# Altium footprint library Relays.PcbLib: 113 footprints (part 5 of 8)
Each footprint in its own frame and in the unit in brackets; x right, y up, seen from the top. Pads: shape width x height; smd on the part's side, far side on the other; paste and mask are expansions set on the pad; w line width, h text height; cw(c..) or ccw(c..) is an arc to the next point about the centre after c.
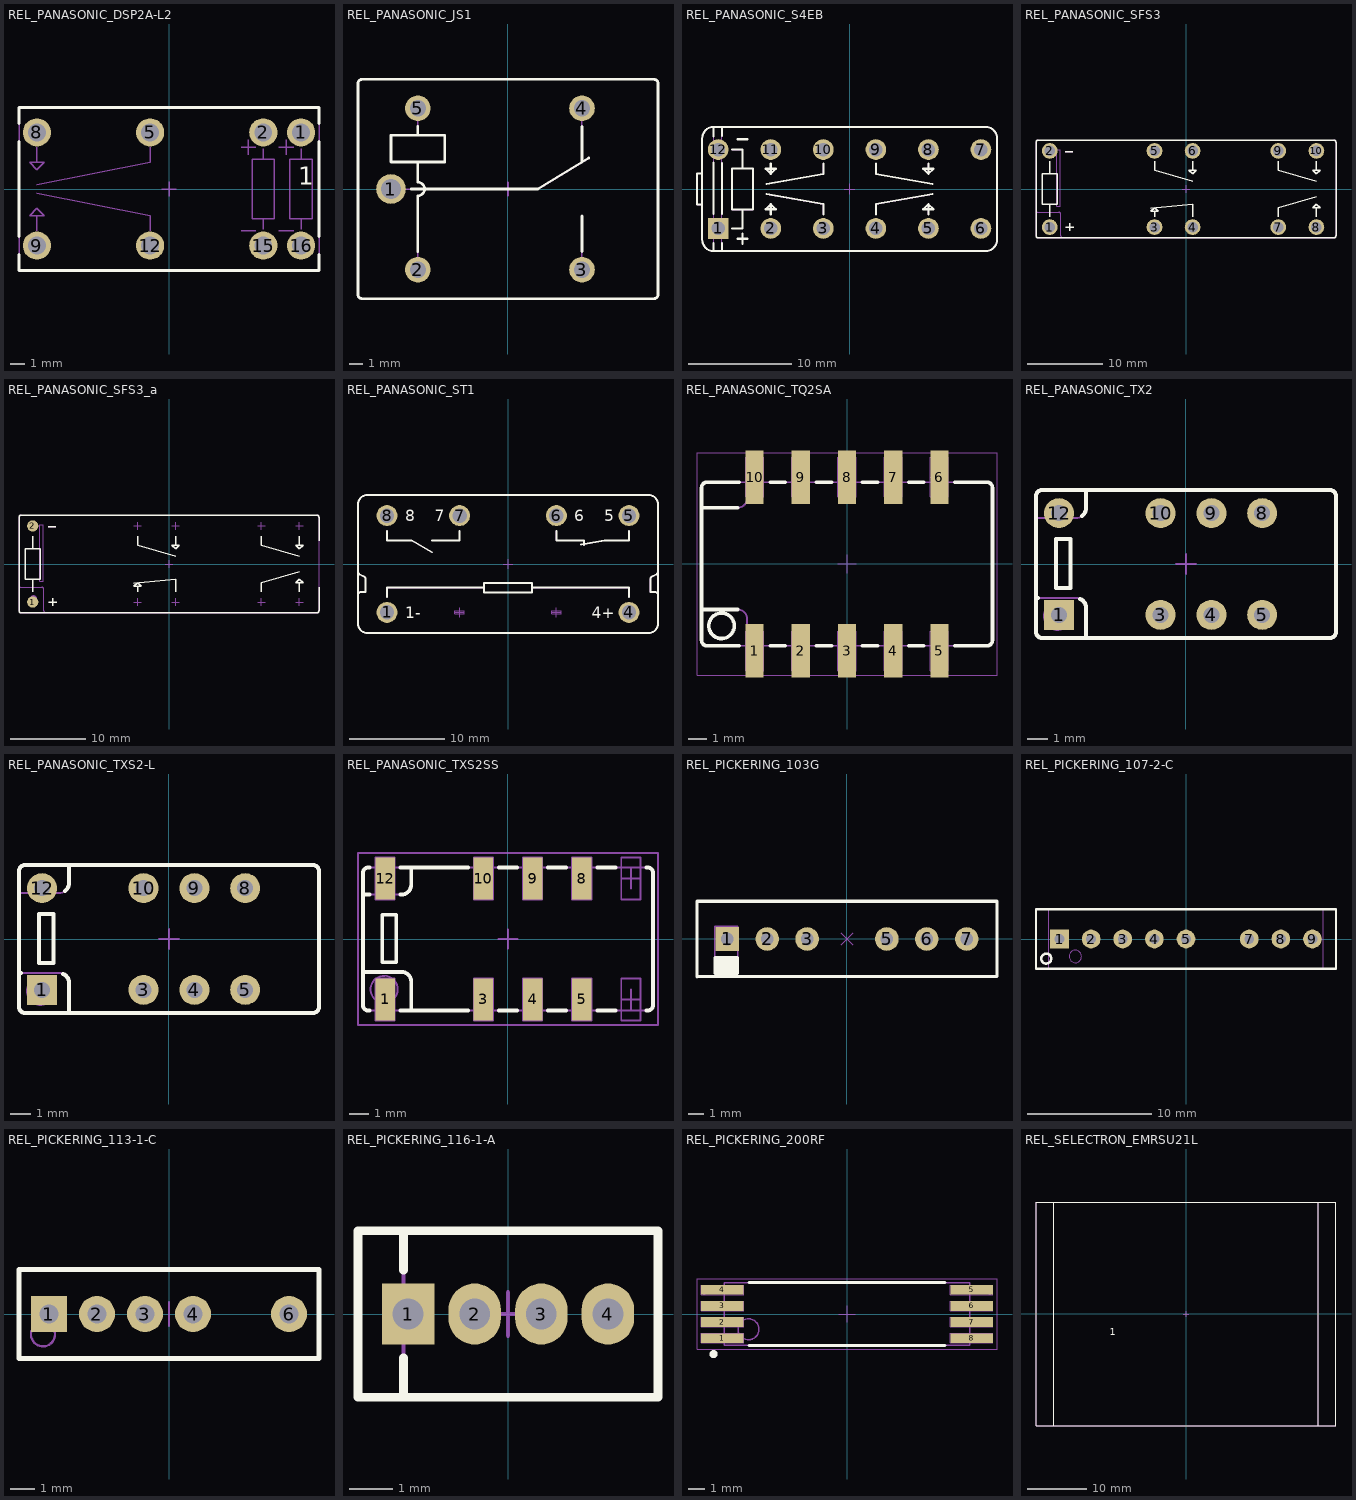
[diagram p4: the footprints below, top view; thin cyan lines are the x and y axes]

## REL_PANASONIC_DSP2A-L2 [mm] "8 Leads 2 Coil Latching 2 Form A (DPST) Relay, PANASONIC DSP Series, Body 20.2mm x 11mm"
height 10.5
pads (8):
  round 1.9 hole 1.2: 1(8.89,3.81) 2(6.35,3.81) 5(-1.27,3.81) 8(-8.89,3.81) 9(-8.89,-3.81) 12(-1.27,-3.81) 15(6.35,-3.81) 16(8.89,-3.81)
Top Overlay:
  lines w0.2: -10.1,-4.409 -10.1,-5.5 10.1,-5.5 10.1,-4.409 ; -10.1,-3.211 -10.1,3.211 ; -10.1,4.409 -10.1,5.5 10.1,5.5 10.1,4.409 ; 10.1,-3.211 10.1,3.211
  text "1" at 8.7,0.3 h1.2
Mechanical 8:
  lines w0.1: -9.39,-3.81 -8.89,-3.81 ; -9.39,3.81 -8.89,3.81 ; -8.89,-4.31 -8.89,-3.81 ; -8.89,-3.31 -8.89,-3.81 ; -8.89,3.31 -8.89,3.81 ; -8.89,4.31 -8.89,3.81 ; -8.39,-3.81 -8.89,-3.81 ; -8.39,3.81 -8.89,3.81 ; -1.77,-3.81 -1.27,-3.81 ; -1.77,3.81 -1.27,3.81 ; -1.27,-4.31 -1.27,-3.81 ; -1.27,-3.31 -1.27,-3.81 ; -1.27,3.31 -1.27,3.81 ; -1.27,4.31 -1.27,3.81 ; -0.77,-3.81 -1.27,-3.81 ; -0.77,3.81 -1.27,3.81 ; -0.5,0 0,0 ; 0,-0.5 0,0 ; 0,0.5 0,0 ; 0.5,0 0,0 ; 5.85,-3.81 6.35,-3.81 ; 5.85,3.81 6.35,3.81 ; 6.35,-4.31 6.35,-3.81 ; 6.35,-3.31 6.35,-3.81 ; 6.35,3.31 6.35,3.81 ; 6.35,4.31 6.35,3.81 ; 6.85,-3.81 6.35,-3.81 ; 6.85,3.81 6.35,3.81 ; 8.39,-3.81 8.89,-3.81 ; 8.39,3.81 8.89,3.81 ; 8.89,-4.31 8.89,-3.81 ; 8.89,-3.31 8.89,-3.81 ; 8.89,3.31 8.89,3.81 ; 8.89,4.31 8.89,3.81 ; 9.39,-3.81 8.89,-3.81 ; 9.39,3.81 8.89,3.81
Mechanical 14:
  lines w0.1: -8.89,-2.81 -8.89,-1.81 ; -8.89,-0.289 -1.27,-1.81 -1.27,-2.81 ; -8.89,0.289 -1.27,1.81 -1.27,2.81 ; -8.89,1.81 -8.89,2.81 ; 4.85,-2.81 5.85,-2.81 ; 4.85,2.81 5.85,2.81 ; 5.35,2.31 5.35,3.31 ; 6.35,-2.7 6.35,-2 ; 6.35,2 6.35,2.7 ; 7.39,-2.81 8.39,-2.81 ; 7.39,2.81 8.39,2.81 ; 7.89,2.31 7.89,3.31 ; 8.89,-2.7 8.89,-2 ; 8.89,2 8.89,2.7 ; -10.1,-5.5 -10.1,5.5 10.1,5.5 10.1,-5.5 -10.1,-5.5 ; -9.39,-1.81 -8.89,-1.31 -8.39,-1.81 -9.39,-1.81 ; -9.39,1.81 -8.89,1.31 -8.39,1.81 -9.39,1.81 ; 5.6,-2 5.6,2 7.1,2 7.1,-2 5.6,-2 ; 8.14,-2 8.14,2 9.64,2 9.64,-2 8.14,-2
3D body "REL_PANASONIC_DSP2-L2.stp": height 10.5, standoff -3.5, extent -10.1,-5.5 10.1,5.5

## REL_PANASONIC_JS1 [mm] "5 Leads Relay, Row Spacing 12 mm; Body 22mm x 16mm, JS Series"
height 16.3
pads (5):
  round 2.2 hole 1.5: 1(-8.7,0)
  round 1.9 hole 1.2: 2(-6.7,-6) 3(5.5,-6) 4(5.5,6) 5(-6.7,6)
Top Overlay:
  lines w0.2: -7.2,0 2.2,0 6,2.303 ; -6.7,-4.65 -6.7,-0.5 ccw(c-6.7,0) -6.7,0.5 -6.7,2 ; -6.7,4 -6.7,4.65 ; 5.5,-4.65 5.5,-2 ; 5.5,2 5.5,4.65 ; -11.15,-7.85 ccw(c-10.85,-7.85) -10.85,-8.15 10.85,-8.15 ccw(c10.85,-7.85) 11.15,-7.85 11.15,7.85 ccw(c10.85,7.85) 10.85,8.15 -10.85,8.15 ccw(c-10.85,7.85) -11.15,7.85 -11.15,-7.85 ; -8.7,2 -8.7,4 -4.7,4 -4.7,2 -8.7,2
Mechanical 8:
  lines w0.127: -9.2,0 -8.7,0 ; -8.7,-0.5 -8.7,0 ; -8.7,0.5 -8.7,0 ; -8.2,0 -8.7,0 ; -7.2,-6 -6.7,-6 ; -7.2,6 -6.7,6 ; -6.7,-6.5 -6.7,-6 ; -6.7,-5.5 -6.7,-6 ; -6.7,5.5 -6.7,6 ; -6.7,6.5 -6.7,6 ; -6.2,-6 -6.7,-6 ; -6.2,6 -6.7,6 ; -0.5,0 0,0 ; 0,-0.5 0,0 ; 0,0.5 0,0 ; 0.5,0 0,0 ; 5,-6 5.5,-6 ; 5,6 5.5,6 ; 5.5,-6.5 5.5,-6 ; 5.5,-5.5 5.5,-6 ; 5.5,5.5 5.5,6 ; 5.5,6.5 5.5,6 ; 6,-6 5.5,-6 ; 6,6 5.5,6
Mechanical 14:
  lines w0.1: -8.7,0 2.2,0 6,2.303 ; -6.7,-6 -6.7,-0.5 ccw(c-6.7,0) -6.7,0.5 -6.7,2 ; -6.7,4 -6.7,6 ; 5.5,-6 5.5,-2 ; 5.5,2 5.5,6 ; -8.7,2 -8.7,4 -4.7,4 -4.7,2 -8.7,2
  lines w0.127: -11.15,-7.85 ccw(c-10.85,-7.85) -10.85,-8.15 10.85,-8.15 ccw(c10.85,-7.85) 11.15,-7.85 11.15,7.85 ccw(c10.85,7.85) 10.85,8.15 -10.85,8.15 ccw(c-10.85,7.85) -11.15,7.85 -11.15,-7.85
3D body "REL_PANASONIC_JS1.stp": height 16.7, standoff -3.5, extent -11.15,-8.15 11.15,8.15

## REL_PANASONIC_S4EB [mm] "12 Leads Single Side Stable Relay, PANASONIC S Series, Body 29mm x 12mm x 10.9mm H"
height 10.9
pads (12):
  rect 2x2 hole 1.3: 1(-12.7,-3.81)
  round 2 hole 1.3: 2(-7.62,-3.81) 3(-2.54,-3.81) 4(2.54,-3.81) 5(7.62,-3.81) 6(12.7,-3.81) 7(12.7,3.81) 8(7.62,3.81) 9(2.54,3.81) 10(-2.54,3.81) 11(-7.62,3.81) 12(-12.7,3.81)
Top Overlay:
  lines w0.2: -14.25,-1.5 -14.75,-1.5 -14.75,1.5 -14.25,1.5 ; -13.15,-5.2 -13.15,-6 ; -13.15,-2.4 -13.15,2.537 ; -13.15,5.083 -13.15,6 ; -12.35,-6 -12.35,-5.2 ; -12.35,-2.4 -12.35,2.506 ; -12.35,5.114 -12.35,6 ; -11.35,-3.81 -10.35,-3.81 -10.35,-2 ; -11.35,3.81 -10.35,3.81 -10.35,2 ; -10.85,-4.81 -9.85,-4.81 ; -10.85,4.81 -9.85,4.81 ; -10.35,-5.31 -10.35,-4.31 ; -8.035,-0.491 -2.54,-1.46 -2.54,-2.46 ; -8.035,0.491 -2.54,1.46 -2.54,2.46 ; -7.62,-2.46 -7.62,-1.46 ; -7.62,2.46 -7.62,1.46 ; 2.54,-2.46 2.54,-1.46 8.035,-0.491 ; 2.54,2.46 2.54,1.46 8.035,0.491 ; 7.62,-2.46 7.62,-1.46 ; 7.62,2.46 7.62,1.46 ; -13.15,-6 cw(c-13.15,-4.9) -14.25,-4.9 -14.25,4.9 cw(c-13.15,4.9) -13.15,6 ; -13.15,-6 13.15,-6 ccw(c13.15,-4.9) 14.25,-4.9 14.25,4.9 ccw(c13.15,4.9) 13.15,6 -13.15,6 ; -7.62,-1.46 -8.12,-1.96 -7.12,-1.96 -7.62,-1.46 ; -7.62,1.46 -8.12,1.96 -7.12,1.96 -7.62,1.46 ; 7.62,-1.46 8.12,-1.96 7.12,-1.96 7.62,-1.46 ; 7.62,1.46 8.12,1.96 7.12,1.96 7.62,1.46 ; -11.35,-2 -11.35,2 -9.35,2 -9.35,-2 -11.35,-2
Mechanical 8:
  lines w0.05: -13.2,-3.81 -12.7,-3.81 ; -13.2,3.81 -12.7,3.81 ; -12.7,-4.31 -12.7,-3.81 ; -12.7,-3.31 -12.7,-3.81 ; -12.7,3.31 -12.7,3.81 ; -12.7,4.31 -12.7,3.81 ; -12.2,-3.81 -12.7,-3.81 ; -12.2,3.81 -12.7,3.81 ; -8.12,-3.81 -7.62,-3.81 ; -8.12,3.81 -7.62,3.81 ; -7.62,-4.31 -7.62,-3.81 ; -7.62,-3.31 -7.62,-3.81 ; -7.62,3.31 -7.62,3.81 ; -7.62,4.31 -7.62,3.81 ; -7.12,-3.81 -7.62,-3.81 ; -7.12,3.81 -7.62,3.81 ; -3.04,-3.81 -2.54,-3.81 ; -3.04,3.81 -2.54,3.81 ; -2.54,-4.31 -2.54,-3.81 ; -2.54,-3.31 -2.54,-3.81 ; -2.54,3.31 -2.54,3.81 ; -2.54,4.31 -2.54,3.81 ; -2.04,-3.81 -2.54,-3.81 ; -2.04,3.81 -2.54,3.81 ; -0.5,0 0,0 ; 0,-0.5 0,0 ; 0,0.5 0,0 ; 0.5,0 0,0 ; 2.04,-3.81 2.54,-3.81 ; 2.04,3.81 2.54,3.81 ; 2.54,-4.31 2.54,-3.81 ; 2.54,-3.31 2.54,-3.81 ; 2.54,3.31 2.54,3.81 ; 2.54,4.31 2.54,3.81 ; 3.04,-3.81 2.54,-3.81 ; 3.04,3.81 2.54,3.81 ; 7.12,-3.81 7.62,-3.81 ; 7.12,3.81 7.62,3.81 ; 7.62,-4.31 7.62,-3.81 ; 7.62,-3.31 7.62,-3.81 ; 7.62,3.31 7.62,3.81 ; 7.62,4.31 7.62,3.81 ; 8.12,-3.81 7.62,-3.81 ; 8.12,3.81 7.62,3.81 ; 12.2,-3.81 12.7,-3.81 ; 12.2,3.81 12.7,3.81 ; 12.7,-4.31 12.7,-3.81 ; 12.7,-3.31 12.7,-3.81 ; 12.7,3.31 12.7,3.81 ; 12.7,4.31 12.7,3.81 ; 13.2,-3.81 12.7,-3.81 ; 13.2,3.81 12.7,3.81
  text "12" at -13.33,1.285 h1
  text "11" at -8.12,1.31 h1
  text "10" at -3.14,1.31 h1
  text "9" at 2.173,1.334 h1
  text "8" at 7.267,1.31 h1
  text "7" at 12.367,1.31 h1
  text "6" at 12.355,-2.332 h1
  text "5" at 7.245,-2.289 h1
  text "4" at 2.14,-2.31 h1
  text "3" at -2.911,-2.289 h1
  text "2" at -7.987,-2.335 h1
  text "1" at -12.95,-2.31 h1
Mechanical 14:
  lines w0.1: -14.25,-1.5 -14.75,-1.5 -14.75,1.5 -14.25,1.5 ; -12.35,-6 -12.35,6 ; -11.35,-3.81 -10.35,-3.81 -10.35,-2 ; -11.35,3.81 -10.35,3.81 -10.35,2 ; -10.85,-4.81 -9.85,-4.81 ; -10.85,4.81 -9.85,4.81 ; -10.35,-5.31 -10.35,-4.31 ; -8.035,-0.491 -2.54,-1.46 -2.54,-2.46 ; -8.035,0.491 -2.54,1.46 -2.54,2.46 ; -7.62,-2.46 -7.62,-1.46 ; -7.62,2.46 -7.62,1.46 ; 2.54,-2.46 2.54,-1.46 8.035,-0.491 ; 2.54,2.46 2.54,1.46 8.035,0.491 ; 7.62,-2.46 7.62,-1.46 ; 7.62,2.46 7.62,1.46 ; -13.15,-6 cw(c-13.15,-4.9) -14.25,-4.9 -14.25,4.9 cw(c-13.15,4.9) -13.15,6 ; -13.15,-6 -13.15,6 ; -13.15,-6 13.15,-6 ccw(c13.15,-4.9) 14.25,-4.9 14.25,4.9 ccw(c13.15,4.9) 13.15,6 -13.15,6 ; -7.62,-1.46 -8.12,-1.96 -7.12,-1.96 -7.62,-1.46 ; -7.62,1.46 -8.12,1.96 -7.12,1.96 -7.62,1.46 ; 7.62,-1.46 8.12,-1.96 7.12,-1.96 7.62,-1.46 ; 7.62,1.46 8.12,1.96 7.12,1.96 7.62,1.46 ; -11.35,-2 -11.35,2 -9.35,2 -9.35,-2 -11.35,-2
3D body "REL_PANASONIC_S4EB.stp": height 10.9, standoff -3.6, extent -14.75,-6 14.25,6

## REL_PANASONIC_SFS3 [mm] "Relay, 10 Leads, Row Spacing 10.16mm,PANASONIC SF Series, Body 40mm x 13mm (Use Only Without Socket)"
height 24
pads (10):
  round 2.1 hole 1.4: 1(-18.17,-5.08) 2(-18.17,5.08) 3(-4.2,-5.08) 4(0.88,-5.08) 5(-4.2,5.08) 6(0.88,5.08) 7(12.31,-5.08) 8(17.39,-5.08) 9(12.31,5.08) 10(17.39,5.08)
Top Overlay:
  lines w0.2: -18.17,-3.68 -18.17,-2 ; -18.17,2 -18.17,3.68 ; -16.1,5 -15.1,5 ; -16,-5.1 -15,-5.1 ; -15.5,-5.6 -15.5,-4.6 ; -4.7,-2.549 0.88,-2 0.88,-3.68 ; -4.2,-3.68 -4.2,-3 ; -4.2,3.68 -4.2,2.5 0.88,1 ; 0.88,2.5 0.88,3.68 ; 12.31,-3.68 12.31,-2.5 17.39,-1 ; 12.31,3.68 12.31,2.5 17.39,1 ; 17.39,-3.68 17.39,-2.5 ; 17.39,2.5 17.39,3.68 ; -20,-6.2 ccw(c-19.7,-6.2) -19.7,-6.5 19.7,-6.5 ccw(c19.7,-6.2) 20,-6.2 20,6.2 ccw(c19.7,6.2) 19.7,6.5 -19.7,6.5 ccw(c-19.7,6.2) -20,6.2 -20,-6.2 ; -19.17,-2 -19.17,2 -17.17,2 -17.17,-2 -19.17,-2 ; -4.7,-3 -4.2,-2.5 -3.7,-3 -4.7,-3 ; 0.38,2.5 0.88,2 1.38,2.5 0.38,2.5 ; 16.89,-2.5 17.39,-2 17.89,-2.5 16.89,-2.5 ; 16.89,2.5 17.39,2 17.89,2.5 16.89,2.5
Mechanical 8:
  lines w0.05: -18.67,-5.08 -18.17,-5.08 ; -18.67,5.08 -18.17,5.08 ; -18.17,-5.58 -18.17,-5.08 ; -18.17,-4.58 -18.17,-5.08 ; -18.17,4.58 -18.17,5.08 ; -18.17,5.58 -18.17,5.08 ; -17.67,-5.08 -18.17,-5.08 ; -17.67,5.08 -18.17,5.08 ; -4.7,-5.08 -4.2,-5.08 ; -4.7,5.08 -4.2,5.08 ; -4.2,-5.58 -4.2,-5.08 ; -4.2,-4.58 -4.2,-5.08 ; -4.2,4.58 -4.2,5.08 ; -4.2,5.58 -4.2,5.08 ; -3.7,-5.08 -4.2,-5.08 ; -3.7,5.08 -4.2,5.08 ; -0.5,0 0,0 ; 0,-0.5 0,0 ; 0,0.5 0,0 ; 0.38,-5.08 0.88,-5.08 ; 0.38,5.08 0.88,5.08 ; 0.5,0 0,0 ; 0.88,-5.58 0.88,-5.08 ; 0.88,-4.58 0.88,-5.08 ; 0.88,4.58 0.88,5.08 ; 0.88,5.58 0.88,5.08 ; 1.38,-5.08 0.88,-5.08 ; 1.38,5.08 0.88,5.08 ; 11.81,-5.08 12.31,-5.08 ; 11.81,5.08 12.31,5.08 ; 12.31,-5.58 12.31,-5.08 ; 12.31,-4.58 12.31,-5.08 ; 12.31,4.58 12.31,5.08 ; 12.31,5.58 12.31,5.08 ; 12.81,-5.08 12.31,-5.08 ; 12.81,5.08 12.31,5.08 ; 16.89,-5.08 17.39,-5.08 ; 16.89,5.08 17.39,5.08 ; 17.39,-5.58 17.39,-5.08 ; 17.39,-4.58 17.39,-5.08 ; 17.39,4.58 17.39,5.08 ; 17.39,5.58 17.39,5.08 ; 17.89,-5.08 17.39,-5.08 ; 17.89,5.08 17.39,5.08
Mechanical 14:
  circle w0.1: c-18.1,-4.75 r0.425
  circle w0.1: c-18.1,-4.75 r0.5
  lines w0.1: -20,-2.8 ccw(c-19.7,-2.8) -19.7,-3.1 -17,-3.1 cw(c-17,-3.4) -16.7,-3.4 -16.7,-6.2 ccw(c-16.4,-6.2) -16.4,-6.5 ; -16.1,5 -15.1,5 ; -16,-5.1 -15,-5.1 ; -15.5,-5.6 -15.5,-4.6 ; -20,-6.2 ccw(c-19.7,-6.2) -19.7,-6.5 19.7,-6.5 ccw(c19.7,-6.2) 20,-6.2 20,6.2 ccw(c19.7,6.2) 19.7,6.5 -19.7,6.5 ccw(c-19.7,6.2) -20,6.2 -20,-6.2 ; -17.25,-2.283 -17.25,5.217 -16.75,5.217 -16.75,-2.283 -17.25,-2.283
3D body "REL_PANASONIC_SFS3.stp": height 24, standoff -3.9, extent -20,-6.5 20,6.5

## REL_PANASONIC_SFS3_a [mm] "Relay, 10 Leads, Row Spacing 10.16mm,PANASONIC SF Series, Body 40mm x 13mm (Do Not Use Alone, Use Only With Socket)"
height 24
pads (2):
  round 1.5 smd paste-0.76 mask-0.76: 1(-18.17,-5.08) 2(-18.17,5.08)
Top Overlay:
  lines w0.2: -18.17,-3.68 -18.17,-2 ; -18.17,2 -18.17,3.68 ; -16.1,5 -15.1,5 ; -16,-5.1 -15,-5.1 ; -15.5,-5.6 -15.5,-4.6 ; -4.7,-2.549 0.88,-2 0.88,-3.68 ; -4.2,-3.68 -4.2,-3 ; -4.2,3.68 -4.2,2.5 0.88,1 ; 0.88,2.5 0.88,3.68 ; 12.31,-3.68 12.31,-2.5 17.39,-1 ; 12.31,3.68 12.31,2.5 17.39,1 ; 17.39,-3.68 17.39,-2.5 ; 17.39,2.5 17.39,3.68 ; 20,-3.1 20,-6.2 cw(c19.7,-6.2) 19.7,-6.5 -19.7,-6.5 cw(c-19.7,-6.2) -20,-6.2 -20,6.2 cw(c-19.7,6.2) -19.7,6.5 19.7,6.5 cw(c19.7,6.2) 20,6.2 20,3.1 ; -19.17,-2 -19.17,2 -17.17,2 -17.17,-2 -19.17,-2 ; -4.7,-3 -4.2,-2.5 -3.7,-3 -4.7,-3 ; 0.38,2.5 0.88,2 1.38,2.5 0.38,2.5 ; 16.89,-2.5 17.39,-2 17.89,-2.5 16.89,-2.5 ; 16.89,2.5 17.39,2 17.89,2.5 16.89,2.5
Mechanical 8:
  lines w0.05: -18.67,-5.08 -18.17,-5.08 ; -18.67,5.08 -18.17,5.08 ; -18.17,-5.58 -18.17,-5.08 ; -18.17,-4.58 -18.17,-5.08 ; -18.17,4.58 -18.17,5.08 ; -18.17,5.58 -18.17,5.08 ; -17.67,-5.08 -18.17,-5.08 ; -17.67,5.08 -18.17,5.08 ; -4.7,-5.08 -4.2,-5.08 ; -4.7,5.08 -4.2,5.08 ; -4.2,-5.58 -4.2,-5.08 ; -4.2,-4.58 -4.2,-5.08 ; -4.2,4.58 -4.2,5.08 ; -4.2,5.58 -4.2,5.08 ; -3.7,-5.08 -4.2,-5.08 ; -3.7,5.08 -4.2,5.08 ; -0.5,0 0,0 ; 0,-0.5 0,0 ; 0,0.5 0,0 ; 0.38,-5.08 0.88,-5.08 ; 0.38,5.08 0.88,5.08 ; 0.5,0 0,0 ; 0.88,-5.58 0.88,-5.08 ; 0.88,-4.58 0.88,-5.08 ; 0.88,4.58 0.88,5.08 ; 0.88,5.58 0.88,5.08 ; 1.38,-5.08 0.88,-5.08 ; 1.38,5.08 0.88,5.08 ; 11.81,-5.08 12.31,-5.08 ; 11.81,5.08 12.31,5.08 ; 12.31,-5.58 12.31,-5.08 ; 12.31,-4.58 12.31,-5.08 ; 12.31,4.58 12.31,5.08 ; 12.31,5.58 12.31,5.08 ; 12.81,-5.08 12.31,-5.08 ; 12.81,5.08 12.31,5.08 ; 16.89,-5.08 17.39,-5.08 ; 16.89,5.08 17.39,5.08 ; 17.39,-5.58 17.39,-5.08 ; 17.39,-4.58 17.39,-5.08 ; 17.39,4.58 17.39,5.08 ; 17.39,5.58 17.39,5.08 ; 17.89,-5.08 17.39,-5.08 ; 17.89,5.08 17.39,5.08
  text "Must be Used with PANASONIC SFS4-PS Socket" at -16,-0.5 h0.95
Mechanical 14:
  circle w0.1: c-18.1,-4.75 r0.425
  circle w0.1: c-18.1,-4.75 r0.5
  lines w0.1: -20,-2.8 ccw(c-19.7,-2.8) -19.7,-3.1 -17,-3.1 cw(c-17,-3.4) -16.7,-3.4 -16.7,-6.2 ccw(c-16.4,-6.2) -16.4,-6.5 ; -16.1,5 -15.1,5 ; -16,-5.1 -15,-5.1 ; -15.5,-5.6 -15.5,-4.6 ; -20,-6.2 ccw(c-19.7,-6.2) -19.7,-6.5 19.7,-6.5 ccw(c19.7,-6.2) 20,-6.2 20,6.2 ccw(c19.7,6.2) 19.7,6.5 -19.7,6.5 ccw(c-19.7,6.2) -20,6.2 -20,-6.2 ; -17.25,-2.283 -17.25,5.217 -16.75,5.217 -16.75,-2.283 -17.25,-2.283
3D body "REL_PANASONIC_SFS3.stp": height 31.2, standoff 3.3, extent -20,-6.5 20,6.5

## REL_PANASONIC_ST1 [mm] "8 Leads, Single Side Stable Relay, PANASONIC ST Series, Body 31.5mm x 14.5mm"
height 11.8
pads (6):
  round 2.2 hole 1.5: 1(-12.7,-5.08) 4(12.7,-5.08) 5(12.7,5.08) 6(5.08,5.08) 7(-5.08,5.08) 8(-12.7,5.08)
Top Overlay:
  lines w0.2: -15.75,-3.25 cw(c-15.45,-3.25) -15.45,-2.95 -14.95,-2.95 -14.95,-1.585 ccw(c-15.25,-1.585) -15.116,-1.317 -15.584,-1.083 cw(c-15.45,-0.815) -15.75,-0.815 ; -12.7,-3.48 -12.7,-2.48 -2.5,-2.48 ; -12.7,3.48 -12.7,2.48 -10.14,2.48 -7.975,1.23 ; -7.975,2.48 -5.08,2.48 -5.08,3.48 ; 2.5,-2.48 12.7,-2.48 12.7,-3.48 ; 5.08,3.48 5.08,2.48 7.975,2.48 7.975,1.98 ; 7.678,2.046 10.14,2.48 12.7,2.48 12.7,3.48 ; 15.75,-3.25 ccw(c15.45,-3.25) 15.45,-2.95 14.95,-2.95 14.95,-1.585 cw(c15.25,-1.585) 15.116,-1.317 15.584,-1.083 ccw(c15.45,-0.815) 15.75,-0.815 ; -15.75,-6.25 ccw(c-14.75,-6.25) -14.75,-7.25 14.75,-7.25 ccw(c14.75,-6.25) 15.75,-6.25 15.75,6.25 ccw(c14.75,6.25) 14.75,7.25 -14.75,7.25 ccw(c-14.75,6.25) -15.75,6.25 -15.75,-6.25 ; -2.5,-2.98 2.5,-2.98 2.5,-1.98 -2.5,-1.98 -2.5,-2.98
  text "1-" at -10.8,-5.68 h1.2
  text "4+" at 8.8,-5.68 h1.2
  text "8" at -10.8,4.48 h1.2
  text "7" at -7.68,4.48 h1.2
  text "6" at 6.98,4.48 h1.2
  text "5" at 10.1,4.48 h1.2
Mechanical 8:
  lines w0.05: -13.2,-5.08 -12.7,-5.08 ; -13.2,5.08 -12.7,5.08 ; -12.7,-5.58 -12.7,-5.08 ; -12.7,-4.58 -12.7,-5.08 ; -12.7,4.58 -12.7,5.08 ; -12.7,5.58 -12.7,5.08 ; -12.2,-5.08 -12.7,-5.08 ; -12.2,5.08 -12.7,5.08 ; -5.58,-5.08 -5.08,-5.08 ; -5.58,5.08 -5.08,5.08 ; -5.08,-5.58 -5.08,-5.08 ; -5.08,-4.58 -5.08,-5.08 ; -5.08,4.58 -5.08,5.08 ; -5.08,5.58 -5.08,5.08 ; -4.58,-5.08 -5.08,-5.08 ; -4.58,5.08 -5.08,5.08 ; -0.5,0 0,0 ; 0,-0.5 0,0 ; 0,0.5 0,0 ; 0.5,0 0,0 ; 4.58,-5.08 5.08,-5.08 ; 4.58,5.08 5.08,5.08 ; 5.08,-5.58 5.08,-5.08 ; 5.08,-4.58 5.08,-5.08 ; 5.08,4.58 5.08,5.08 ; 5.08,5.58 5.08,5.08 ; 5.58,-5.08 5.08,-5.08 ; 5.58,5.08 5.08,5.08 ; 12.2,-5.08 12.7,-5.08 ; 12.2,5.08 12.7,5.08 ; 12.7,-5.58 12.7,-5.08 ; 12.7,-4.58 12.7,-5.08 ; 12.7,4.58 12.7,5.08 ; 12.7,5.58 12.7,5.08 ; 13.2,-5.08 12.7,-5.08 ; 13.2,5.08 12.7,5.08 ; -5.58,-5.23 -5.58,-4.93 -4.58,-4.93 -4.58,-5.23 -5.58,-5.23 ; 4.58,-5.23 4.58,-4.93 5.58,-4.93 5.58,-5.23 4.58,-5.23
  text "3" at 2.48,-5.68 h1.2
  text "2" at -3.18,-5.68 h1.2
Mechanical 14:
  lines w0.1: -15.75,-3.25 cw(c-15.45,-3.25) -15.45,-2.95 -14.95,-2.95 -14.95,-1.585 ccw(c-15.25,-1.585) -15.116,-1.317 -15.584,-1.083 cw(c-15.45,-0.815) -15.75,-0.815 ; -12.7,-3.48 -12.7,-2.48 -2.5,-2.48 ; -12.7,3.48 -12.7,2.48 -10.14,2.48 -7.975,1.23 ; -7.975,2.48 -5.08,2.48 -5.08,3.48 ; 2.5,-2.48 12.7,-2.48 12.7,-3.48 ; 5.08,3.48 5.08,2.48 7.975,2.48 7.975,1.98 ; 7.678,2.046 10.14,2.48 12.7,2.48 12.7,3.48 ; 15.75,-3.25 ccw(c15.45,-3.25) 15.45,-2.95 14.95,-2.95 14.95,-1.585 cw(c15.25,-1.585) 15.116,-1.317 15.584,-1.083 ccw(c15.45,-0.815) 15.75,-0.815 ; -15.75,-6.25 ccw(c-14.75,-6.25) -14.75,-7.25 14.75,-7.25 ccw(c14.75,-6.25) 15.75,-6.25 15.75,6.25 ccw(c14.75,6.25) 14.75,7.25 -14.75,7.25 ccw(c-14.75,6.25) -15.75,6.25 -15.75,-6.25 ; -2.5,-2.98 -2.5,-1.98 2.5,-1.98 2.5,-2.98 -2.5,-2.98
  text "5" at 10.1,4.48 h1.2
  text "6" at 6.98,4.48 h1.2
  text "7" at -7.68,4.48 h1.2
  text "8" at -10.8,4.48 h1.2
  text "4+" at 8.8,-5.68 h1.2
  text "1-" at -10.8,-5.68 h1.2
3D body "REL_PANASONIC_ST1.stp": height 11.8, standoff -3.5, extent -15.75,-7.25 15.75,7.25

## REL_PANASONIC_TQ2SA [mm] "12 Leads Single Side Stable Relay, SMD, Very high sensitivity (140mW) PANASONIC TQ Series, Body 14mm x 9mm x 5.6mm H"
height 5.6
pads (10):
  rect 1x2.94 smd: 1(-5.08,-4.78) 2(-2.54,-4.78) 3(0,-4.78) 4(2.54,-4.78) 5(5.08,-4.78) 6(5.08,4.78) 7(2.54,4.78) 8(0,4.78) 9(-2.54,4.78) 10(-5.08,4.78)
Top Overlay:
  circle w0.2: c-6.9,-3.4 r0.7
  lines w0.2: -8,-2.35 ccw(c-7.85,-2.35) -7.85,-2.5 -6,-2.5 ; -8,2.95 cw(c-7.85,2.95) -7.85,3.1 -7.7,3.1 -6,3.1 ; -5.93,-4.5 -7.7,-4.5 cw(c-7.7,-4.2) -8,-4.2 -8,4.2 cw(c-7.7,4.2) -7.7,4.5 -5.93,4.5 ; -4.23,-4.5 -3.39,-4.5 ; -4.23,4.5 -3.39,4.5 ; -1.69,-4.5 -0.85,-4.5 ; -1.69,4.5 -0.85,4.5 ; 0.85,-4.5 1.69,-4.5 ; 0.85,4.5 1.69,4.5 ; 3.39,-4.5 4.23,-4.5 ; 3.39,4.5 4.23,4.5 ; 5.93,-4.5 7.7,-4.5 ccw(c7.7,-4.2) 8,-4.2 8,4.2 ccw(c7.7,4.2) 7.7,4.5 5.93,4.5
Mechanical 8:
  lines w0.05: -5.58,-4.78 -5.08,-4.78 ; -5.58,4.78 -5.08,4.78 ; -5.08,-5.28 -5.08,-4.78 ; -5.08,-4.28 -5.08,-4.78 ; -5.08,4.28 -5.08,4.78 ; -5.08,5.28 -5.08,4.78 ; -4.58,-4.78 -5.08,-4.78 ; -4.58,4.78 -5.08,4.78 ; -3.04,-4.78 -2.54,-4.78 ; -3.04,4.78 -2.54,4.78 ; -2.54,-5.28 -2.54,-4.78 ; -2.54,-4.28 -2.54,-4.78 ; -2.54,4.28 -2.54,4.78 ; -2.54,5.28 -2.54,4.78 ; -2.04,-4.78 -2.54,-4.78 ; -2.04,4.78 -2.54,4.78 ; -0.5,-4.78 0,-4.78 ; -0.5,0 0,0 ; -0.5,4.78 0,4.78 ; 0,-5.28 0,-4.78 ; 0,-4.28 0,-4.78 ; 0,-0.5 0,0 ; 0,0.5 0,0 ; 0,4.28 0,4.78 ; 0,5.28 0,4.78 ; 0.5,-4.78 0,-4.78 ; 0.5,0 0,0 ; 0.5,4.78 0,4.78 ; 2.04,-4.78 2.54,-4.78 ; 2.04,4.78 2.54,4.78 ; 2.54,-5.28 2.54,-4.78 ; 2.54,-4.28 2.54,-4.78 ; 2.54,4.28 2.54,4.78 ; 2.54,5.28 2.54,4.78 ; 3.04,-4.78 2.54,-4.78 ; 3.04,4.78 2.54,4.78 ; 4.58,-4.78 5.08,-4.78 ; 4.58,4.78 5.08,4.78 ; 5.08,-5.28 5.08,-4.78 ; 5.08,-4.28 5.08,-4.78 ; 5.08,4.28 5.08,4.78 ; 5.08,5.28 5.08,4.78 ; 5.58,-4.78 5.08,-4.78 ; 5.58,4.78 5.08,4.78 ; -5.58,-5.86 -5.58,-3.7 -4.58,-3.7 -4.58,-5.86 -5.58,-5.86 ; -5.58,3.7 -4.58,3.7 -4.58,5.86 -5.58,5.86 -5.58,3.7 ; -3.04,-5.86 -3.04,-3.7 -2.04,-3.7 -2.04,-5.86 -3.04,-5.86 ; -3.04,3.7 -2.04,3.7 -2.04,5.86 -3.04,5.86 -3.04,3.7 ; -0.5,-5.86 0.5,-5.86 0.5,-3.7 -0.5,-3.7 -0.5,-5.86 ; -0.5,3.7 0.5,3.7 0.5,5.86 -0.5,5.86 -0.5,3.7 ; 2.04,-5.86 3.04,-5.86 3.04,-3.7 2.04,-3.7 2.04,-5.86 ; 2.04,3.7 3.04,3.7 3.04,5.86 2.04,5.86 2.04,3.7 ; 4.58,-5.86 5.58,-5.86 5.58,-3.7 4.58,-3.7 4.58,-5.86 ; 4.58,3.7 5.58,3.7 5.58,5.86 4.58,5.86 4.58,3.7
Mechanical 14:
  circle w0.1: c-6.9,-3.4 r0.7
  lines w0.1: -8,-2.35 ccw(c-7.85,-2.35) -7.85,-2.5 -6,-2.5 cw(c-6,-3) -5.5,-3 -5.5,-4.35 ccw(c-5.35,-4.35) -5.35,-4.5 ; -8,2.95 cw(c-7.85,2.95) -7.85,3.1 -7.7,3.1 -6,3.1 ccw(c-6,3.6) -5.5,3.6 -5.5,4.35 cw(c-5.35,4.35) -5.35,4.5 ; -8,-4.2 ccw(c-7.7,-4.2) -7.7,-4.5 7.7,-4.5 ccw(c7.7,-4.2) 8,-4.2 8,4.2 ccw(c7.7,4.2) 7.7,4.5 -7.7,4.5 ccw(c-7.7,4.2) -8,4.2 -8,-4.2
Mechanical 15:
  lines w0.05: -8.25,-6.11 -8.25,6.11 8.25,6.11 8.25,-6.11 -8.25,-6.11
3D body "REL_PANASONIC_TQ2SA.stp": height 5.6, standoff 0, extent -8,-5.75 8,5.75

## REL_PANASONIC_TX2 [mm] "8 Leads, Single Side Stable, Thru-hole, Very high sensitivity (140mW) Relay, PANASONIC TX Series, Body 15mm x 7.4mm x 8.2mm H"
height 8.2
pads (8):
  rect 1.5x1.5 hole 0.8: 1(-6.35,-2.54)
  round 1.5 hole 0.8: 3(-1.27,-2.54) 4(1.27,-2.54) 5(3.81,-2.54) 8(3.81,2.54) 9(1.27,2.54) 10(-1.27,2.54) 12(-6.35,2.54)
Top Overlay:
  lines w0.2: -7.5,-1.7 -7.4,-1.7 ; -5.3,-1.742 cw(c-5.5,-2.2) -5,-2.2 -5,-3.7 ; -5.209,2.393 ccw(c-5.5,2.8) -5,2.8 -5,3.7 ; -7.5,-3.4 ccw(c-7.2,-3.4) -7.2,-3.7 7.2,-3.7 ccw(c7.2,-3.4) 7.5,-3.4 7.5,3.4 ccw(c7.2,3.4) 7.2,3.7 -7.2,3.7 ccw(c-7.2,3.4) -7.5,3.4 -7.5,-3.4 ; -6.5,-1.2 -5.775,-1.2 -5.775,1.25 -6.5,1.25 -6.5,-1.2
Mechanical 8:
  lines w0.1: -6.85,-2.54 -6.35,-2.54 ; -6.85,2.54 -6.35,2.54 ; -6.35,-3.04 -6.35,-2.54 ; -6.35,-2.04 -6.35,-2.54 ; -6.35,2.04 -6.35,2.54 ; -6.35,3.04 -6.35,2.54 ; -5.85,-2.54 -6.35,-2.54 ; -5.85,2.54 -6.35,2.54 ; -1.77,-2.54 -1.27,-2.54 ; -1.77,2.54 -1.27,2.54 ; -1.27,-3.04 -1.27,-2.54 ; -1.27,-2.04 -1.27,-2.54 ; -1.27,2.04 -1.27,2.54 ; -1.27,3.04 -1.27,2.54 ; -0.77,-2.54 -1.27,-2.54 ; -0.77,2.54 -1.27,2.54 ; -0.5,0 0,0 ; 0,-0.5 0,0 ; 0,0.5 0,0 ; 0.5,0 0,0 ; 0.77,-2.54 1.27,-2.54 ; 0.77,2.54 1.27,2.54 ; 1.27,-3.04 1.27,-2.54 ; 1.27,-2.04 1.27,-2.54 ; 1.27,2.04 1.27,2.54 ; 1.27,3.04 1.27,2.54 ; 1.77,-2.54 1.27,-2.54 ; 1.77,2.54 1.27,2.54 ; 3.31,-2.54 3.81,-2.54 ; 3.31,2.54 3.81,2.54 ; 3.81,-3.04 3.81,-2.54 ; 3.81,-2.04 3.81,-2.54 ; 3.81,2.04 3.81,2.54 ; 3.81,3.04 3.81,2.54 ; 4.31,-2.54 3.81,-2.54 ; 4.31,2.54 3.81,2.54
Mechanical 14:
  circle w0.1: c-6.4,-2.6 r0.7
  lines w0.1: -7.5,-1.7 -5.5,-1.7 cw(c-5.5,-2.2) -5,-2.2 -5,-3.7 ; -7.5,2.3 -5.5,2.3 ccw(c-5.5,2.8) -5,2.8 -5,3.7 ; -7.5,-3.4 ccw(c-7.2,-3.4) -7.2,-3.7 7.2,-3.7 ccw(c7.2,-3.4) 7.5,-3.4 7.5,3.4 ccw(c7.2,3.4) 7.2,3.7 -7.2,3.7 ccw(c-7.2,3.4) -7.5,3.4 -7.5,-3.4 ; -6.5,-1.2 -5.775,-1.2 -5.775,1.25 -6.5,1.25 -6.5,-1.2
3D body "REL_PANASONIC_TXS2-L.stp": height 8.2, standoff -3.2, extent -7.5,-3.7 7.5,3.7

## REL_PANASONIC_TXS2-L [mm] "8 Leads, 1 coil latching, Thru-hole, Very high sensitivity (50mW) Relay, PANASONIC TX-S Series, Body 15mm x 7.4mm x 8.2mm H"
height 8.2
pads (8):
  rect 1.5x1.5 hole 0.8: 1(-6.35,-2.54)
  round 1.5 hole 0.8: 3(-1.27,-2.54) 4(1.27,-2.54) 5(3.81,-2.54) 8(3.81,2.54) 9(1.27,2.54) 10(-1.27,2.54) 12(-6.35,2.54)
Top Overlay:
  lines w0.2: -7.5,-1.7 -7.4,-1.7 ; -5.3,-1.742 cw(c-5.5,-2.2) -5,-2.2 -5,-3.7 ; -5.209,2.393 ccw(c-5.5,2.8) -5,2.8 -5,3.7 ; -7.5,-3.4 ccw(c-7.2,-3.4) -7.2,-3.7 7.2,-3.7 ccw(c7.2,-3.4) 7.5,-3.4 7.5,3.4 ccw(c7.2,3.4) 7.2,3.7 -7.2,3.7 ccw(c-7.2,3.4) -7.5,3.4 -7.5,-3.4 ; -6.5,-1.2 -6.5,1.25 -5.775,1.25 -5.775,-1.2 -6.5,-1.2
Mechanical 8:
  lines w0.1: -6.85,-2.54 -6.35,-2.54 ; -6.85,2.54 -6.35,2.54 ; -6.35,-3.04 -6.35,-2.54 ; -6.35,-2.04 -6.35,-2.54 ; -6.35,2.04 -6.35,2.54 ; -6.35,3.04 -6.35,2.54 ; -5.85,-2.54 -6.35,-2.54 ; -5.85,2.54 -6.35,2.54 ; -1.77,-2.54 -1.27,-2.54 ; -1.77,2.54 -1.27,2.54 ; -1.27,-3.04 -1.27,-2.54 ; -1.27,-2.04 -1.27,-2.54 ; -1.27,2.04 -1.27,2.54 ; -1.27,3.04 -1.27,2.54 ; -0.77,-2.54 -1.27,-2.54 ; -0.77,2.54 -1.27,2.54 ; -0.5,0 0,0 ; 0,-0.5 0,0 ; 0,0.5 0,0 ; 0.5,0 0,0 ; 0.77,-2.54 1.27,-2.54 ; 0.77,2.54 1.27,2.54 ; 1.27,-3.04 1.27,-2.54 ; 1.27,-2.04 1.27,-2.54 ; 1.27,2.04 1.27,2.54 ; 1.27,3.04 1.27,2.54 ; 1.77,-2.54 1.27,-2.54 ; 1.77,2.54 1.27,2.54 ; 3.31,-2.54 3.81,-2.54 ; 3.31,2.54 3.81,2.54 ; 3.81,-3.04 3.81,-2.54 ; 3.81,-2.04 3.81,-2.54 ; 3.81,2.04 3.81,2.54 ; 3.81,3.04 3.81,2.54 ; 4.31,-2.54 3.81,-2.54 ; 4.31,2.54 3.81,2.54
Mechanical 14:
  circle w0.1: c-6.4,-2.6 r0.7
  lines w0.1: -7.5,-1.7 -5.5,-1.7 cw(c-5.5,-2.2) -5,-2.2 -5,-3.7 ; -7.5,2.3 -5.5,2.3 ccw(c-5.5,2.8) -5,2.8 -5,3.7 ; -7.5,-3.4 ccw(c-7.2,-3.4) -7.2,-3.7 7.2,-3.7 ccw(c7.2,-3.4) 7.5,-3.4 7.5,3.4 ccw(c7.2,3.4) 7.2,3.7 -7.2,3.7 ccw(c-7.2,3.4) -7.5,3.4 -7.5,-3.4 ; -6.5,-1.2 -6.5,1.25 -5.775,1.25 -5.775,-1.2 -6.5,-1.2
3D body "REL_PANASONIC_TXS2-L.stp": height 8.2, standoff -3.2, extent -7.5,-3.7 7.5,3.7

## REL_PANASONIC_TXS2SS [mm] "8 Leads Single Side Stable SMD Relay, PANASONIC TX-S Series, Body 15mm x 7.4mm x 10mm H"
height 10
pads (8):
  rect 1x2.16 smd: 1(-6.35,-3.12) 3(-1.27,-3.12) 4(1.27,-3.12) 5(3.81,-3.12) 8(3.81,3.12) 9(1.27,3.12) 10(-1.27,3.12) 12(-6.35,3.12)
Top Overlay:
  lines w0.2: -7.5,-1.7 -5.5,-1.7 cw(c-5.5,-2.2) -5,-2.2 -5,-3.7 ; -7.5,2.3 -7.15,2.3 ; -7.15,-3.7 -7.2,-3.7 cw(c-7.2,-3.4) -7.5,-3.4 -7.5,3.4 cw(c-7.2,3.4) -7.2,3.7 -7.15,3.7 ; -5.55,-3.7 -2.07,-3.7 ; -5.55,2.3 -5.5,2.3 ccw(c-5.5,2.8) -5,2.8 -5,3.7 ; -5.55,3.7 -2.07,3.7 ; -0.47,-3.7 0.47,-3.7 ; -0.47,3.7 0.47,3.7 ; 2.07,-3.7 3.01,-3.7 ; 2.07,3.7 3.01,3.7 ; 4.61,-3.7 5.55,-3.7 ; 4.61,3.7 5.55,3.7 ; 7.15,-3.7 7.2,-3.7 ccw(c7.2,-3.4) 7.5,-3.4 7.5,3.4 ccw(c7.2,3.4) 7.2,3.7 7.15,3.7 ; -6.5,-1.2 -6.5,1.25 -5.775,1.25 -5.775,-1.2 -6.5,-1.2
Mechanical 8:
  lines w0.1: -6.85,-3.12 -6.35,-3.12 ; -6.85,3.12 -6.35,3.12 ; -6.35,-3.62 -6.35,-3.12 ; -6.35,-2.62 -6.35,-3.12 ; -6.35,2.62 -6.35,3.12 ; -6.35,3.62 -6.35,3.12 ; -5.85,-3.12 -6.35,-3.12 ; -5.85,3.12 -6.35,3.12 ; -1.77,-3.12 -1.27,-3.12 ; -1.77,3.12 -1.27,3.12 ; -1.27,-3.62 -1.27,-3.12 ; -1.27,-2.62 -1.27,-3.12 ; -1.27,2.62 -1.27,3.12 ; -1.27,3.62 -1.27,3.12 ; -0.77,-3.12 -1.27,-3.12 ; -0.77,3.12 -1.27,3.12 ; -0.5,0 0,0 ; 0,-0.5 0,0 ; 0,0.5 0,0 ; 0.5,0 0,0 ; 0.77,-3.12 1.27,-3.12 ; 0.77,3.12 1.27,3.12 ; 1.27,-3.62 1.27,-3.12 ; 1.27,-2.62 1.27,-3.12 ; 1.27,2.62 1.27,3.12 ; 1.27,3.62 1.27,3.12 ; 1.77,-3.12 1.27,-3.12 ; 1.77,3.12 1.27,3.12 ; 3.31,-3.12 3.81,-3.12 ; 3.31,3.12 3.81,3.12 ; 3.81,-3.62 3.81,-3.12 ; 3.81,-2.62 3.81,-3.12 ; 3.81,2.62 3.81,3.12 ; 3.81,3.62 3.81,3.12 ; 4.31,-3.12 3.81,-3.12 ; 4.31,3.12 3.81,3.12 ; 5.85,-3.12 6.35,-3.12 ; 5.85,3.12 6.35,3.12 ; 6.35,-3.62 6.35,-3.12 ; 6.35,-2.62 6.35,-3.12 ; 6.35,2.62 6.35,3.12 ; 6.35,3.62 6.35,3.12 ; 6.85,-3.12 6.35,-3.12 ; 6.85,3.12 6.35,3.12 ; -6.85,-4.2 -6.85,-2.04 -5.85,-2.04 -5.85,-4.2 -6.85,-4.2 ; -6.85,2.04 -6.85,4.2 -5.85,4.2 -5.85,2.04 -6.85,2.04 ; -1.77,-4.2 -1.77,-2.04 -0.77,-2.04 -0.77,-4.2 -1.77,-4.2 ; -1.77,2.04 -1.77,4.2 -0.77,4.2 -0.77,2.04 -1.77,2.04 ; 0.77,-4.2 0.77,-2.04 1.77,-2.04 1.77,-4.2 0.77,-4.2 ; 0.77,2.04 0.77,4.2 1.77,4.2 1.77,2.04 0.77,2.04 ; 3.31,-4.2 3.31,-2.04 4.31,-2.04 4.31,-4.2 3.31,-4.2 ; 3.31,2.04 3.31,4.2 4.31,4.2 4.31,2.04 3.31,2.04 ; 5.85,-4.2 5.85,-2.04 6.85,-2.04 6.85,-4.2 5.85,-4.2 ; 5.85,2.04 5.85,4.2 6.85,4.2 6.85,2.04 5.85,2.04
Mechanical 14:
  circle w0.1: c-6.4,-2.6 r0.7
  lines w0.1: -7.5,-1.7 -5.5,-1.7 cw(c-5.5,-2.2) -5,-2.2 -5,-3.7 ; -7.5,2.3 -5.5,2.3 ccw(c-5.5,2.8) -5,2.8 -5,3.7 ; -7.5,-3.4 ccw(c-7.2,-3.4) -7.2,-3.7 7.2,-3.7 ccw(c7.2,-3.4) 7.5,-3.4 7.5,3.4 ccw(c7.2,3.4) 7.2,3.7 -7.2,3.7 ccw(c-7.2,3.4) -7.5,3.4 -7.5,-3.4 ; -6.5,-1.2 -6.5,1.25 -5.775,1.25 -5.775,-1.2 -6.5,-1.2
Mechanical 15:
  lines w0.1: -7.75,-4.45 -7.75,4.45 7.75,4.45 7.75,-4.45 -7.75,-4.45
3D body "REL_PANASONIC_TXS2SS.stp": height 10, standoff 0, extent -7.5,-3.7 7.5,3.7

## REL_PICKERING_103G [mm] "6 Leads, Body 19.1 x 4.8mm, 1 Form A Low Capacitance SIL Reed Relay 103 Series"
height 8.1
pads (6):
  rect 1.5x1.5 hole 0.8: 1(-7.62,0)
  round 1.5 hole 0.8: 2(-5.08,0) 3(-2.54,0) 5(2.54,0) 6(5.08,0) 7(7.62,0)
Top Overlay:
  lines w0.2: -8.411,-2.098 -6.961,-2.098 ; -8.411,-1.998 -6.961,-1.998 ; -8.411,-1.898 -6.961,-1.898 ; -8.411,-1.798 -6.961,-1.798 ; -8.411,-1.698 -6.961,-1.698 ; -8.411,-1.598 -6.961,-1.598 ; -8.411,-1.498 -6.961,-1.498 ; -8.411,-1.398 -6.961,-1.398 ; -8.411,-1.298 -6.961,-1.298 ; -9.552,-2.402 -9.552,2.402 9.552,2.402 9.552,-2.398 -9.552,-2.402 ; -8.411,-2.198 -6.961,-2.198 -6.961,-1.198 -8.411,-1.198 -8.411,-2.198
Mechanical 8:
  lines w0.1: -8.12,0 -7.62,0 ; -7.62,-0.5 -7.62,0 ; -7.62,0.5 -7.62,0 ; -7.12,0 -7.62,0 ; -5.58,0 -5.08,0 ; -5.08,-0.5 -5.08,0 ; -5.08,0.5 -5.08,0 ; -4.58,0 -5.08,0 ; -3.04,0 -2.54,0 ; -2.54,-0.5 -2.54,0 ; -2.54,0.5 -2.54,0 ; -2.04,0 -2.54,0 ; -0.354,-0.354 0,0 ; -0.354,0.354 0,0 ; 0.354,-0.354 0,0 ; 0.354,0.354 0,0 ; 2.04,0 2.54,0 ; 2.54,-0.5 2.54,0 ; 2.54,0.5 2.54,0 ; 3.04,0 2.54,0 ; 4.58,0 5.08,0 ; 5.08,-0.5 5.08,0 ; 5.08,0.5 5.08,0 ; 5.58,0 5.08,0 ; 7.12,0 7.62,0 ; 7.62,-0.5 7.62,0 ; 7.62,0.5 7.62,0 ; 8.12,0 7.62,0
Mechanical 14:
  lines w0.1: -9.552,-2.402 9.552,-2.398 9.552,2.402 -9.552,2.402 -9.552,-2.402 ; -8.411,-2.198 -8.411,0.802 -6.961,0.802 -6.961,-2.198 -8.411,-2.198
3D body "REL_PICKERING_103G.stp": height 8.1, standoff -3.33, extent -9.551,-2.401 9.552,2.402

## REL_PICKERING_107-2-C [mm] "8 Leads, Body 24.1 x 4.8mm, 2 Form C Mini-SIL Reed Relay 107 Series"
height 10.2
pads (8):
  rect 1.5x1.5 hole 0.8: 1(-10.16,0)
  round 1.5 hole 0.8: 2(-7.62,0) 3(-5.08,0) 4(-2.54,0) 5(0,0) 7(5.08,0) 8(7.62,0) 9(10.16,0)
Top Overlay:
  circle w0.2: c-11.225,-1.575 r0.4
  lines w0.2: -12.05,-2.4 -12.05,2.4 12.05,2.4 12.05,-2.4 -12.05,-2.4
Mechanical 8:
  lines w0.1: -10.66,0 -10.16,0 ; -10.16,-0.5 -10.16,0 ; -10.16,0.5 -10.16,0 ; -9.66,0 -10.16,0 ; -8.12,0 -7.62,0 ; -7.62,-0.5 -7.62,0 ; -7.62,0.5 -7.62,0 ; -7.12,0 -7.62,0 ; -5.58,0 -5.08,0 ; -5.08,-0.5 -5.08,0 ; -5.08,0.5 -5.08,0 ; -4.58,0 -5.08,0 ; -3.04,0 -2.54,0 ; -2.54,-0.5 -2.54,0 ; -2.54,0.5 -2.54,0 ; -2.04,0 -2.54,0 ; -0.5,0 0,0 ; 0,-0.5 0,0 ; 0,0.5 0,0 ; 0.5,0 0,0 ; 4.58,0 5.08,0 ; 5.08,-0.5 5.08,0 ; 5.08,0.5 5.08,0 ; 5.58,0 5.08,0 ; 7.12,0 7.62,0 ; 7.62,-0.5 7.62,0 ; 7.62,0.5 7.62,0 ; 8.12,0 7.62,0 ; 9.66,0 10.16,0 ; 10.16,-0.5 10.16,0 ; 10.16,0.5 10.16,0 ; 10.66,0 10.16,0
Mechanical 14:
  circle w0.1: c-8.89,-1.4 r0.5
  lines w0.1: -11.034,-2.4 -11.034,2.4 ; 11.034,-2.4 11.034,2.4 ; -12.05,-2.4 -12.05,2.4 12.05,2.4 12.05,-2.4 -12.05,-2.4
3D body "REL_PICKERING_107-2-C.stp": height 10.2, standoff -3.29, extent -12.05,-2.4 12.05,2.4

## REL_PICKERING_113-1-C [mm] "5 Leads, Body 12.5 x 3.7mm, 1 Form C Mini-SIL Reed Relay 113 Series"
height 6.6
pads (5):
  rect 1.5x1.5 hole 0.8: 1(-5,0)
  round 1.5 hole 0.8: 2(-3,0) 3(-1,0) 4(1,0) 6(5,0)
Top Overlay:
  lines w0.2: -6.25,-1.85 6.25,-1.85 6.25,1.85 -6.25,1.85 -6.25,-1.85
Mechanical 8:
  lines w0.1: -5.5,0 -5,0 ; -5,-0.5 -5,0 ; -5,0.5 -5,0 ; -4.5,0 -5,0 ; -3.5,0 -3,0 ; -3,-0.5 -3,0 ; -3,0.5 -3,0 ; -2.5,0 -3,0 ; -1.5,0 -1,0 ; -1,-0.5 -1,0 ; -1,0.5 -1,0 ; -0.5,0 -1,0 ; 0,-0.5 0,0 0,0.5 ; 0.5,0 1,0 ; 1,-0.5 1,0 ; 1,0.5 1,0 ; 1.5,0 1,0 ; 4.5,0 5,0 ; 5,-0.5 5,0 ; 5,0.5 5,0 ; 5.5,0 5,0
Mechanical 14:
  circle w0.1: c-5.25,-0.85 r0.5
  lines w0.1: -6.25,-1.85 6.25,-1.85 6.25,1.85 -6.25,1.85 -6.25,-1.85
3D body "REL_PICKERING_113-1-C.stp": height 6.6, standoff -3.3, extent -6.25,-1.85 6.25,1.85

## REL_PICKERING_116-1-A [mm] "4 Leads, Body 6.86 x 3.81mm, 1Form A SIL Reed Relay, 116 Series"
height 12.6
pads (4):
  rect 1.2x1.4 hole 0.7: 1(-2.286,0)
  oval 1.2x1.4 hole 0.7: 2(-0.762,0) 3(0.762,0) 4(2.286,0)
Top Overlay:
  lines w0.2: -2.389,-1.905 -2.389,-1 ; -2.389,1 -2.389,1.905 ; -3.43,-1.905 -3.43,1.905 3.43,1.905 3.43,-1.905 -3.43,-1.905
Mechanical 8:
  lines w0.1: -2.786,0 -2.286,0 ; -2.286,-0.5 -2.286,0 ; -2.286,0.5 -2.286,0 ; -1.786,0 -2.286,0 ; -1.262,0 -0.762,0 ; -0.762,-0.5 -0.762,0 ; -0.762,0.5 -0.762,0 ; -0.5,0 0,0 ; -0.262,0 -0.762,0 ; 0,-0.5 0,0 ; 0,0.5 0,0 ; 0.262,0 0.762,0 ; 0.5,0 0,0 ; 0.762,-0.5 0.762,0 ; 0.762,0.5 0.762,0 ; 1.262,0 0.762,0 ; 1.786,0 2.286,0 ; 2.286,-0.5 2.286,0 ; 2.286,0.5 2.286,0 ; 2.786,0 2.286,0
Mechanical 14:
  lines w0.1: -2.389,-1.905 -2.389,1.905 ; -3.43,-1.905 -3.43,1.905 3.43,1.905 3.43,-1.905 -3.43,-1.905
3D body "REL_PICKERING_116-1-A.stp": height 12.6, standoff -3.17, extent -3.43,-1.905 3.43,1.905

## REL_PICKERING_200RF [mm] "8 Leads, Body 15.25mm x 4mm x 6.8mm,  1Form A RF, 120 Series"
height 6.8
pads (8):
  rect 2.65x0.6 smd: 1(-7.75,-1.5) 2(-7.75,-0.5) 3(-7.75,0.5) 4(-7.75,1.5) 5(7.75,1.5) 6(7.75,0.5) 7(7.75,-0.5) 8(7.75,-1.5)
Top Overlay:
  circle w0.25: c-8.3,-2.5 r0.125
  lines w0.2: -6.075,-1.95 6.075,-1.95 ; -6.075,1.95 6.075,1.95
Mechanical 8:
  lines w0.05: -0.5,0 0,0 ; 0,-0.5 0,0 ; 0,0.5 0,0 ; 0.5,0 0,0 ; -9.075,-1.8 -9.075,-1.2 ; -9.075,-1.8 -6.425,-1.8 -6.425,-1.2 -9.075,-1.2 ; -9.075,-1.8 -7.75,-1.5 -9.075,-1.2 ; -9.075,-0.8 -9.075,-0.2 ; -9.075,-0.8 -6.425,-0.8 -6.425,-0.2 -9.075,-0.2 ; -9.075,-0.8 -7.75,-0.5 -9.075,-0.2 ; -9.075,0.2 -9.075,0.8 ; -9.075,0.2 -6.425,0.2 -6.425,0.8 -9.075,0.8 ; -9.075,0.2 -7.75,0.5 -9.075,0.8 ; -9.075,1.2 -9.075,1.8 ; -9.075,1.2 -6.425,1.2 -6.425,1.8 -9.075,1.8 ; -9.075,1.2 -7.75,1.5 -9.075,1.8 ; 9.075,-1.8 9.075,-1.2 ; 9.075,-1.8 6.425,-1.8 6.425,-1.2 9.075,-1.2 ; 9.075,-1.8 7.75,-1.5 9.075,-1.2 ; 9.075,-0.8 9.075,-0.2 ; 9.075,-0.8 6.425,-0.8 6.425,-0.2 9.075,-0.2 ; 9.075,-0.8 7.75,-0.5 9.075,-0.2 ; 9.075,0.2 9.075,0.8 ; 9.075,0.2 6.425,0.2 6.425,0.8 9.075,0.8 ; 9.075,0.2 7.75,0.5 9.075,0.8 ; 9.075,1.2 9.075,1.8 ; 9.075,1.2 6.425,1.2 6.425,1.8 9.075,1.8 ; 9.075,1.2 7.75,1.5 9.075,1.8
Mechanical 14:
  circle w0.1: c-6.124,-0.949 r0.65
  lines w0.1: -7.625,-1.66 -8.398,-1.66 -8.398,-1.34 -7.625,-1.34 ; -7.625,-0.66 -8.398,-0.66 -8.398,-0.34 -7.625,-0.34 ; -7.625,0.34 -8.398,0.34 -8.398,0.66 -7.625,0.66 ; -7.625,1.34 -8.398,1.34 -8.398,1.66 -7.625,1.66 ; 7.625,-1.66 8.398,-1.66 8.398,-1.34 7.625,-1.34 ; 7.625,-0.66 8.398,-0.66 8.398,-0.34 7.625,-0.34 ; 7.625,0.34 8.398,0.34 8.398,0.66 7.625,0.66 ; 7.625,1.34 8.398,1.34 8.398,1.66 7.625,1.66 ; -7.625,-1.9 ccw(c-7.575,-1.9) -7.575,-1.95 7.575,-1.95 ccw(c7.575,-1.9) 7.625,-1.9 7.625,1.9 ccw(c7.575,1.9) 7.575,1.95 -7.575,1.95 ccw(c-7.575,1.9) -7.625,1.9 -7.625,-1.9
Mechanical 15:
  lines w0.05: -9.325,-2.2 -9.325,2.2 9.325,2.2 9.325,-2.2 -9.325,-2.2
3D body "REL_PICKERING_200RF.stp": height 6.6, standoff 0, extent -8.398,-1.95 8.398,1.95

## REL_SELECTRON_EMRSU21L [mm] "Round Pluggable 11 Contacts, Body 51mm x 38mm, SELECTRON EMR Series"
height 80
Top Overlay:
  lines w0.2: -22.5,-19 -22.5,19 ; 22.5,-19 22.5,19 ; -25.5,-19 -25.5,19 25.5,19 25.5,-19 -25.5,-19
  text "1" at -12.985,-3.645 h1.2
Mechanical 8:
  lines w0.1: -0.5,0 0,0 ; 0,-0.5 0,0 ; 0,0.5 0,0 ; 0.5,0 0,0
Mechanical 14:
  lines w0.1: -22.5,-19 -22.5,19 ; 22.5,-19 22.5,19 ; -25.5,-19 -25.5,19 25.5,19 25.5,-19 -25.5,-19
  text "1" at -12.985,-3.645 h1.2
3D body "REL_SELECTRON_EMRSU21L.stp": height 67, standoff -13, extent -25.5,-19 25.5,19